# Altium schematic symbol library FPGA_Xilinx_Virtex5.SchLib: 41 symbols (part 26 of 27)
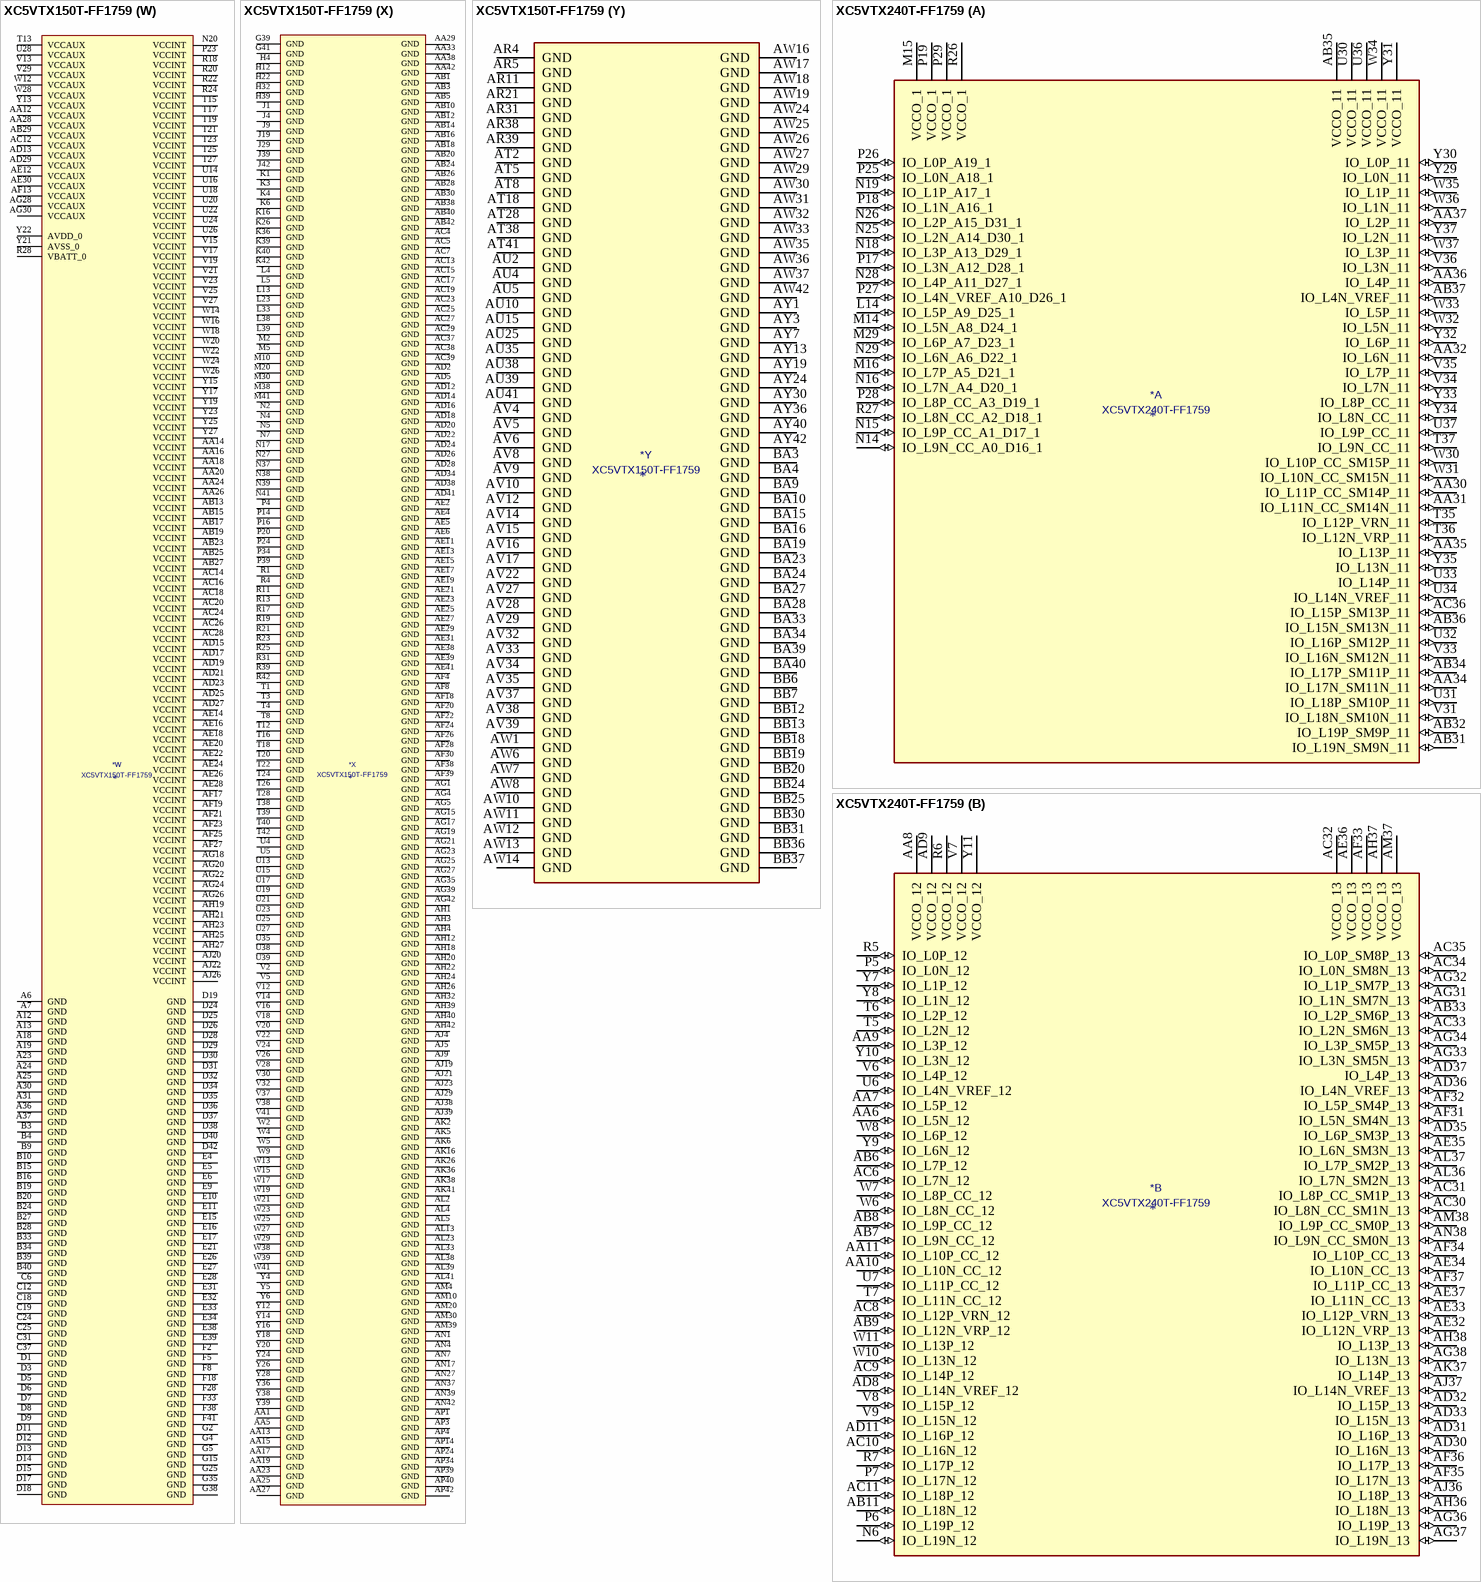
[diagram p162: symbols XC5VTX150T-FF1759 to XC5VTX240T-FF1759]

## XC5VTX150T-FF1759
designator *  value XC5VTX150T-FF1759
ki_keywords: FPGA; ki_description: Virtex 5 TXT 150 XC5VTX150T-FF1759
part A pins: AA30 IO_L11P_CC_SM14P_11 (io), AA31 IO_L11N_CC_SM14N_11 (io), AA32 IO_L6N_11 (io), AA34 IO_L17N_SM11N_11 (io), AA35 IO_L13P_11 (io), AA36 IO_L4P_11 (io), AA37 IO_L2P_11 (io), AB31 IO_L19N_SM9N_11 (io), AB32 IO_L19P_SM9P_11 (io), AB34 IO_L17P_SM11P_11 (io), AB35 VCCO_11 (power), AB36 IO_L15N_SM13N_11 (io), AB37 IO_L4N_VREF_11 (io), AC36 IO_L15P_SM13P_11 (io), L14 IO_L5P_A9_D25_1 (io), M14 IO_L5N_A8_D24_1 (io), M15 VCCO_1 (power), M16 IO_L7P_A5_D21_1 (io), M29 IO_L6P_A7_D23_1 (io), N14 IO_L9N_CC_A0_D16_1 (io), N15 IO_L9P_CC_A1_D17_1 (io), N16 IO_L7N_A4_D20_1 (io), N18 IO_L3P_A13_D29_1 (io), N19 IO_L1P_A17_1 (io), N25 IO_L2N_A14_D30_1 (io), N26 IO_L2P_A15_D31_1 (io), N28 IO_L4P_A11_D27_1 (io), N29 IO_L6N_A6_D22_1 (io), P17 IO_L3N_A12_D28_1 (io), P18 IO_L1N_A16_1 (io), P19 VCCO_1 (power), P25 IO_L0N_A18_1 (io), P26 IO_L0P_A19_1 (io), P27 IO_L4N_VREF_A10_D26_1 (io), P28 IO_L8P_CC_A3_D19_1 (io), P29 VCCO_1 (power), R26 VCCO_1 (power), R27 IO_L8N_CC_A2_D18_1 (io), T35 IO_L12P_VRN_11 (io), T36 IO_L12N_VRP_11 (io), T37 IO_L9N_CC_11 (io), U30 VCCO_11 (power), U31 IO_L18P_SM10P_11 (io), U32 IO_L16P_SM12P_11 (io), U33 IO_L14P_11 (io), U34 IO_L14N_VREF_11 (io), U36 VCCO_11 (power), U37 IO_L9P_CC_11 (io), V31 IO_L18N_SM10N_11 (io), V33 IO_L16N_SM12N_11 (io), V34 IO_L7N_11 (io), V35 IO_L7P_11 (io), V36 IO_L3N_11 (io), W30 IO_L10P_CC_SM15P_11 (io), W31 IO_L10N_CC_SM15N_11 (io), W32 IO_L5N_11 (io), W33 IO_L5P_11 (io), W34 VCCO_11 (power), W35 IO_L1P_11 (io), W36 IO_L1N_11 (io), W37 IO_L3P_11 (io), Y29 IO_L0N_11 (io), Y30 IO_L0P_11 (io), Y31 VCCO_11 (power), Y32 IO_L6P_11 (io), Y33 IO_L8P_CC_11 (io), Y34 IO_L8N_CC_11 (io), Y35 IO_L13N_11 (io), Y37 IO_L2N_11 (io)
part B pins: AA6 IO_L5N_12 (io), AA7 IO_L5P_12 (io), AA8 VCCO_12 (power), AA9 IO_L3P_12 (io), AA10 IO_L10N_CC_12 (io), AA11 IO_L10P_CC_12 (io), AB6 IO_L7P_12 (io), AB7 IO_L9N_CC_12 (io), AB8 IO_L9P_CC_12 (io), AB9 IO_L12N_VRP_12 (io), AB11 IO_L18N_12 (io), AB33 IO_L2P_SM6P_13 (io), AC6 IO_L7N_12 (io), AC8 IO_L12P_VRN_12 (io), AC9 IO_L14P_12 (io), AC10 IO_L16N_12 (io), AC11 IO_L18P_12 (io), AC30 IO_L8N_CC_SM1N_13 (io), AC31 IO_L8P_CC_SM1P_13 (io), AC32 VCCO_13 (power), AC33 IO_L2N_SM6N_13 (io), AC34 IO_L0N_SM8N_13 (io), AC35 IO_L0P_SM8P_13 (io), AD8 IO_L14N_VREF_12 (io), AD9 VCCO_12 (power), AD11 IO_L16P_12 (io), AD30 IO_L16N_13 (io), AD31 IO_L16P_13 (io), AD32 IO_L15P_13 (io), AD33 IO_L15N_13 (io), AD35 IO_L6P_SM3P_13 (io), AD36 IO_L4N_VREF_13 (io), AD37 IO_L4P_13 (io), AE32 IO_L12N_VRP_13 (io), AE33 IO_L12P_VRN_13 (io), AE34 IO_L10N_CC_13 (io), AE35 IO_L6N_SM3N_13 (io), AE36 VCCO_13 (power), AE37 IO_L11N_CC_13 (io), AF31 IO_L5N_SM4N_13 (io), AF32 IO_L5P_SM4P_13 (io), AF33 VCCO_13 (power), AF34 IO_L10P_CC_13 (io), AF35 IO_L17N_13 (io), AF36 IO_L17P_13 (io), AF37 IO_L11P_CC_13 (io), AG31 IO_L1N_SM7N_13 (io), AG32 IO_L1P_SM7P_13 (io), AG33 IO_L3N_SM5N_13 (io), AG34 IO_L3P_SM5P_13 (io), AG36 IO_L19P_13 (io), AG37 IO_L19N_13 (io), AG38 IO_L13N_13 (io), AH36 IO_L18N_13 (io), AH37 VCCO_13 (power), AH38 IO_L13P_13 (io), AJ36 IO_L18P_13 (io), AJ37 IO_L14N_VREF_13 (io), AK37 IO_L14P_13 (io), AL36 IO_L7N_SM2N_13 (io), AL37 IO_L7P_SM2P_13 (io), AM37 VCCO_13 (power), AM38 IO_L9P_CC_SM0P_13 (io), AN38 IO_L9N_CC_SM0N_13 (io), N6 IO_L19N_12 (io), P5 IO_L0N_12 (io), P6 IO_L19P_12 (io), P7 IO_L17N_12 (io), R5 IO_L0P_12 (io), R6 VCCO_12 (power), R7 IO_L17P_12 (io), T5 IO_L2N_12 (io), T6 IO_L2P_12 (io), T7 IO_L11N_CC_12 (io), U6 IO_L4N_VREF_12 (io), U7 IO_L11P_CC_12 (io), V6 IO_L4P_12 (io), V7 VCCO_12 (power), V8 IO_L15P_12 (io), V9 IO_L15N_12 (io), W6 IO_L8N_CC_12 (io), W7 IO_L8P_CC_12 (io), W8 IO_L6P_12 (io), W10 IO_L13N_12 (io), W11 IO_L13P_12 (io), Y7 IO_L1P_12 (io), Y8 IO_L1N_12 (io), Y9 IO_L6N_12 (io), Y10 IO_L3N_12 (io), Y11 VCCO_12 (power)
part C pins: AD6 IO_L1N_14 (io), AD7 IO_L1P_14 (io), AD10 IO_L17P_14 (io), AE7 VCCO_14 (power), AE8 IO_L3P_14 (io), AE9 IO_L16N_14 (io), AE10 IO_L17N_14 (io), AF5 IO_L5P_14 (io), AF6 IO_L5N_14 (io), AF7 IO_L3N_14 (io), AF9 IO_L16P_14 (io), AF10 IO_L8P_CC_14 (io), AF11 IO_L2P_14 (io), AF12 IO_L0N_14 (io), AG6 IO_L7P_14 (io), AG7 IO_L9P_CC_14 (io), AG8 IO_L10P_CC_14 (io), AG9 IO_L8N_CC_14 (io), AG10 VCCO_14 (power), AG11 IO_L2N_14 (io), AG12 IO_L0P_14 (io), AH5 IO_L7N_14 (io), AH6 IO_L9N_CC_14 (io), AH7 VCCO_14 (power), AH8 IO_L10N_CC_14 (io), AH9 IO_L13P_14 (io), AH10 IO_L4N_VREF_14 (io), AH11 IO_L4P_14 (io), AH17 VCCO_2 (power), AJ6 IO_L12P_VRN_14 (io), AJ7 IO_L12N_VRP_14 (io), AJ8 IO_L13N_14 (io), AJ17 IO_L0P_CC_RS1_2 (io), AJ18 IO_L2N_A22_2 (io), AK7 IO_L14P_14 (io), AK8 IO_L11P_CC_14 (io), AK9 IO_L6P_14 (io), AK17 IO_L0N_CC_RS0_2 (io), AK18 IO_L2P_A23_2 (io), AK19 IO_L8N_D2_FS2_2 (io), AK27 IO_L1N_CC_A24_2 (io), AK28 IO_L1P_CC_A25_2 (io), AL6 IO_L14N_VREF_14 (io), AL7 IO_L11N_CC_14 (io), AL8 VCCO_14 (power), AL9 IO_L6N_14 (io), AL17 IO_L4P_FCS_B_2 (io), AL18 VCCO_2 (power), AL19 IO_L8P_D3_2 (io), AL27 IO_L3P_A21_2 (io), AL28 VCCO_2 (power), AM5 IO_L18P_14 (io), AM6 IO_L19P_14 (io), AM7 IO_L19N_14 (io), AM17 IO_L4N_VREF_FOE_B_MOSI_2 (io), AM18 IO_L6P_D7_2 (io), AM19 IO_L6N_D6_2 (io), AM27 IO_L3N_A20_2 (io), AN5 IO_L18N_14 (io), AN6 VCCO_14 (power), AN26 IO_L7N_D4_2 (io), AP5 IO_L15P_14 (io), AP6 IO_L15N_14 (io), AP25 IO_L9P_D1_FS1_2 (io), AP26 IO_L7P_D5_2 (io), AP27 IO_L5N_CSO_B_2 (io), AR25 IO_L9N_D0_FS0_2 (io), AR26 VCCO_2 (power), AR27 IO_L5P_FWE_B_2 (io)
part D pins: E7 IO_L3P_24 (io), E8 IO_L3N_24 (io), F6 IO_L5N_24 (io), F7 VCCO_24 (power), G6 IO_L5P_24 (io), G7 IO_L1P_24 (io), G8 IO_L1N_24 (io), G37 IO_L4P_23 (io), H5 IO_L7N_24 (io), H6 IO_L7P_24 (io), H7 VCCO_24 (power), H8 IO_L9N_CC_24 (io), H34 IO_L0N_23 (io), H35 IO_L2P_23 (io), H36 IO_L2N_23 (io), H37 VCCO_23 (power), H38 IO_L4N_VREF_23 (io), J5 IO_L14N_VREF_24 (io), J6 IO_L14P_24 (io), J7 IO_L18P_24 (io), J8 IO_L9P_CC_24 (io), J33 IO_L0P_23 (io), J34 VCCO_23 (power), J35 IO_L15N_23 (io), J36 IO_L15P_23 (io), J37 IO_L8P_CC_23 (io), J38 IO_L8N_CC_23 (io), K5 IO_L4N_VREF_24 (io), K7 IO_L19P_24 (io), K8 IO_L18N_24 (io), K9 IO_L12P_VRN_24 (io), K33 IO_L6N_23 (io), K34 IO_L6P_23 (io), K35 IO_L19N_23 (io), K37 IO_L17P_23 (io), K38 IO_L17N_23 (io), L6 IO_L4P_24 (io), L7 IO_L19N_24 (io), L8 VCCO_24 (power), L9 IO_L12N_VRP_24 (io), L34 IO_L19P_23 (io), L35 IO_L12P_VRN_23 (io), L36 IO_L12N_VRP_23 (io), L37 IO_L16N_23 (io), M6 IO_L17N_24 (io), M7 IO_L17P_24 (io), M8 IO_L15P_24 (io), M9 IO_L16N_24 (io), M34 IO_L14N_VREF_23 (io), M35 VCCO_23 (power), M36 IO_L10N_CC_23 (io), M37 IO_L16P_23 (io), N8 IO_L15N_24 (io), N9 IO_L16P_24 (io), N33 IO_L11N_CC_23 (io), N34 IO_L14P_23 (io), N35 IO_L7N_23 (io), N36 IO_L10P_CC_23 (io), P8 IO_L11N_CC_24 (io), P9 VCCO_24 (power), P10 IO_L10P_CC_24 (io), P33 IO_L11P_CC_23 (io), P35 IO_L7P_23 (io), P36 IO_L5N_23 (io), P37 IO_L1N_23 (io), P38 IO_L3N_23 (io), R8 IO_L8P_CC_24 (io), R9 IO_L11P_CC_24 (io), R10 IO_L10N_CC_24 (io), R32 IO_L13N_23 (io), R33 IO_L13P_23 (io), R34 IO_L9P_CC_23 (io), R35 IO_L5P_23 (io), R36 VCCO_23 (power), R37 IO_L1P_23 (io), R38 IO_L3P_23 (io), T9 IO_L8N_CC_24 (io), T10 IO_L13N_24 (io), T11 IO_L13P_24 (io), T31 IO_L18P_23 (io), T32 IO_L18N_23 (io), T33 VCCO_23 (power), T34 IO_L9N_CC_23 (io), U8 IO_L6N_24 (io), U9 IO_L6P_24 (io), U10 VCCO_24 (power), U11 IO_L2N_24 (io), U12 IO_L0N_24 (io), V10 IO_L2P_24 (io), V11 IO_L0P_24 (io)
part E pins: AH33 IO_L10N_CC_25 (io), AH34 IO_L10P_CC_25 (io), AH35 IO_L12P_VRN_25 (io), AJ10 IO_L4P_26 (io), AJ11 IO_L4N_VREF_26 (io), AJ12 IO_L9P_CC_26 (io), AJ31 IO_L3P_25 (io), AJ32 IO_L3N_25 (io), AJ33 IO_L0P_25 (io), AJ34 VCCO_25 (power), AJ35 IO_L12N_VRP_25 (io), AK10 IO_L2N_26 (io), AK11 VCCO_26 (power), AK12 IO_L9N_CC_26 (io), AK32 IO_L13P_25 (io), AK33 IO_L13N_25 (io), AK34 IO_L0N_25 (io), AK35 IO_L9N_CC_25 (io), AL10 IO_L2P_26 (io), AL11 IO_L7N_26 (io), AL12 IO_L10N_CC_26 (io), AL31 IO_L19P_25 (io), AL32 IO_L19N_25 (io), AL34 IO_L9P_CC_25 (io), AL35 IO_L18P_25 (io), AM8 IO_L17N_26 (io), AM9 IO_L17P_26 (io), AM11 IO_L7P_26 (io), AM12 IO_L10P_CC_26 (io), AM13 IO_L18P_26 (io), AM31 IO_L17P_25 (io), AM32 IO_L17N_25 (io), AM33 IO_L8N_CC_25 (io), AM34 IO_L6P_25 (io), AM35 VCCO_25 (power), AM36 IO_L18N_25 (io), AN8 IO_L15N_26 (io), AN9 IO_L6P_26 (io), AN10 IO_L6N_26 (io), AN11 IO_L3N_26 (io), AN12 VCCO_26 (power), AN13 IO_L18N_26 (io), AN31 IO_L15P_25 (io), AN32 VCCO_25 (power), AN33 IO_L8P_CC_25 (io), AN34 IO_L6N_25 (io), AN35 IO_L16N_25 (io), AN36 IO_L16P_25 (io), AP7 IO_L19N_26 (io), AP8 IO_L15P_26 (io), AP9 VCCO_26 (power), AP10 IO_L3P_26 (io), AP11 IO_L5P_26 (io), AP12 IO_L5N_26 (io), AP13 IO_L16P_26 (io), AP31 IO_L15N_25 (io), AP32 IO_L11P_CC_25 (io), AP33 IO_L11N_CC_25 (io), AP35 IO_L7N_25 (io), AP36 IO_L7P_25 (io), AP37 IO_L14P_25 (io), AP38 IO_L14N_VREF_25 (io), AR6 IO_L19P_26 (io), AR7 IO_L8P_CC_26 (io), AR8 IO_L0P_26 (io), AR9 IO_L0N_26 (io), AR10 IO_L1P_26 (io), AR12 IO_L16N_26 (io), AR35 IO_L4P_25 (io), AR36 VCCO_25 (power), AR37 IO_L5N_25 (io), AT6 IO_L13N_26 (io), AT7 IO_L8N_CC_26 (io), AT9 IO_L1N_26 (io), AT10 IO_L12N_VRP_26 (io), AT11 VCCO_26 (power), AT35 IO_L4N_VREF_25 (io), AT36 IO_L1P_25 (io), AT37 IO_L5P_25 (io), AU6 IO_L13P_26 (io), AU7 VCCO_26 (power), AU8 IO_L11P_CC_26 (io), AU9 IO_L12P_VRN_26 (io), AU11 IO_L14P_26 (io), AU36 IO_L2N_25 (io), AU37 IO_L1N_25 (io), AV7 IO_L11N_CC_26 (io), AV11 IO_L14N_VREF_26 (io), AV36 IO_L2P_25 (io)
part F pins: E12 IO_L4P_28 (io), E13 IO_L4N_VREF_28 (io), E14 IO_L15P_28 (io), E29 IO_L16P_27 (io), E30 IO_L14N_VREF_27 (io), E35 IO_L4N_VREF_27 (io), E36 IO_L4P_27 (io), E37 IO_L6P_27 (io), F9 IO_L0N_28 (io), F10 IO_L0P_28 (io), F11 IO_L2N_28 (io), F12 IO_L11N_CC_28 (io), F13 VCCO_28 (power), F14 IO_L15N_28 (io), F15 IO_L17P_28 (io), F29 IO_L16N_27 (io), F30 IO_L14P_27 (io), F31 IO_L12N_VRP_27 (io), F32 IO_L5N_27 (io), F34 IO_L3P_27 (io), F35 IO_L2P_27 (io), F36 VCCO_27 (power), F37 IO_L6N_27 (io), G9 IO_L3P_28 (io), G10 VCCO_28 (power), G11 IO_L2P_28 (io), G12 IO_L11P_CC_28 (io), G13 IO_L13N_28 (io), G14 IO_L17N_28 (io), G29 IO_L18P_27 (io), G30 VCCO_27 (power), G31 IO_L12P_VRN_27 (io), G32 IO_L5P_27 (io), G33 VCCO_27 (power), G34 IO_L3N_27 (io), G36 IO_L2N_27 (io), H9 IO_L3N_28 (io), H10 IO_L1N_28 (io), H11 IO_L8P_CC_28 (io), H13 IO_L13P_28 (io), H14 IO_L19P_28 (io), H15 IO_L19N_28 (io), H29 IO_L18N_27 (io), H30 IO_L10N_CC_27 (io), H31 IO_L7P_27 (io), H33 IO_L1N_27 (io), J10 IO_L5P_28 (io), J11 IO_L1P_28 (io), J12 IO_L8N_CC_28 (io), J13 IO_L6N_28 (io), J30 IO_L10P_CC_27 (io), J31 IO_L7N_27 (io), J32 IO_L1P_27 (io), K10 IO_L5N_28 (io), K11 VCCO_28 (power), K12 IO_L7N_28 (io), K13 IO_L7P_28 (io), K14 IO_L6P_28 (io), K29 IO_L9P_CC_27 (io), K30 IO_L0N_27 (io), K31 VCCO_27 (power), K32 IO_L8N_CC_27 (io), L10 IO_L10P_CC_28 (io), L11 IO_L10N_CC_28 (io), L12 IO_L9P_CC_28 (io), L29 IO_L9N_CC_27 (io), L30 IO_L0P_27 (io), L31 IO_L8P_CC_27 (io), L32 IO_L11N_CC_27 (io), M11 IO_L14P_28 (io), M12 IO_L9N_CC_28 (io), M13 IO_L12N_VRP_28 (io), M31 IO_L13P_27 (io), M32 IO_L13N_27 (io), M33 IO_L11P_CC_27 (io), N10 IO_L14N_VREF_28 (io), N11 IO_L16N_28 (io), N12 VCCO_28 (power), N13 IO_L12P_VRN_28 (io), N30 IO_L15N_27 (io), N31 IO_L15P_27 (io), N32 VCCO_27 (power), P11 IO_L16P_28 (io), P12 IO_L18P_28 (io), P30 IO_L19P_27 (io), P31 IO_L17P_27 (io), P32 IO_L17N_27 (io), R12 IO_L18N_28 (io), R30 IO_L19N_27 (io)
part G pins: AH29 IO_L0N_29 (io), AH30 IO_L0P_29 (io), AH31 IO_L2P_29 (io), AJ30 IO_L2N_29 (io), AK29 IO_L4P_29 (io), AK30 IO_L4N_VREF_29 (io), AK31 VCCO_29 (power), AL29 IO_L17P_29 (io), AL30 IO_L17N_29 (io), AM28 IO_L9P_CC_29 (io), AM29 IO_L15P_29 (io), AN28 IO_L1P_29 (io), AN29 IO_L9N_CC_29 (io), AN30 IO_L15N_29 (io), AP28 IO_L1N_29 (io), AP29 VCCO_29 (power), AP30 IO_L12N_VRP_29 (io), AR28 IO_L10P_CC_29 (io), AR29 IO_L10N_CC_29 (io), AR30 IO_L12P_VRN_29 (io), AR32 IO_L13P_29 (io), AR33 IO_L8N_CC_29 (io), AR34 IO_L8P_CC_29 (io), AT25 IO_L3N_29 (io), AT26 IO_L3P_29 (io), AT27 IO_L7N_29 (io), AT29 IO_L14P_29 (io), AT30 IO_L19P_29 (io), AT31 IO_L19N_29 (io), AT32 IO_L13N_29 (io), AT33 VCCO_29 (power), AT34 IO_L6N_29 (io), AU26 VCCO_29 (power), AU27 IO_L7P_29 (io), AU28 IO_L14N_VREF_29 (io), AU29 IO_L16P_29 (io), AU30 VCCO_29 (power), AU31 IO_L18N_29 (io), AU32 IO_L11P_CC_29 (io), AU33 IO_L11N_CC_29 (io), AU34 IO_L6P_29 (io), AV25 IO_L5N_29 (io), AV26 IO_L5P_29 (io), AV30 IO_L16N_29 (io), AV31 IO_L18P_29 (io), J14 VCCO_3 (power), J15 IO_L2P_GC_VRN_3 (io), J16 IO_L2N_GC_VRP_3 (io), K15 IO_L4N_GC_VREF_3 (io), K27 IO_L7P_GC_3 (io), K28 IO_L7N_GC_3 (io), L15 IO_L4P_GC_3 (io), L16 IO_L8P_GC_3 (io), L17 IO_L8N_GC_3 (io), L18 VCCO_3 (power), L19 IO_L0P_CC_GC_3 (io), L25 IO_L3N_GC_3 (io), L26 IO_L5P_GC_3 (io), L27 IO_L5N_GC_3 (io), L28 VCCO_3 (power), M17 IO_L6P_GC_3 (io), M18 IO_L6N_GC_3 (io), M19 IO_L0N_CC_GC_3 (io), M24 IO_L1N_CC_GC_3 (io), M25 VCCO_3 (power), M26 IO_L3P_GC_3 (io), M27 IO_L9N_GC_3 (io), M28 IO_L9P_GC_3 (io), N24 IO_L1P_CC_GC_3 (io)
part H pins: AG13 IO_L3N_30 (io), AH13 IO_L5P_30 (io), AH14 IO_L3P_30 (io), AH15 IO_L1N_30 (io), AJ13 IO_L5N_30 (io), AJ14 VCCO_30 (power), AJ15 IO_L1P_30 (io), AJ24 VCCO_4 (power), AJ25 IO_L4P_GC_4 (io), AK13 IO_L7P_30 (io), AK14 IO_L7N_30 (io), AK15 IO_L19P_30 (io), AK20 IO_L9P_CC_GC_4 (io), AK21 VCCO_4 (power), AK23 IO_L8P_CC_GC_4 (io), AK24 IO_L8N_CC_GC_4 (io), AK25 IO_L4N_GC_VREF_4 (io), AL14 IO_L16N_30 (io), AL15 IO_L19N_30 (io), AL16 IO_L4P_30 (io), AL20 IO_L9N_CC_GC_4 (io), AL21 IO_L7P_GC_VRN_4 (io), AL24 IO_L6N_GC_4 (io), AL25 IO_L6P_GC_4 (io), AL26 IO_L0P_GC_D15_4 (io), AM14 IO_L16P_30 (io), AM15 VCCO_30 (power), AM16 IO_L4N_VREF_30 (io), AM21 IO_L7N_GC_VRP_4 (io), AM24 IO_L2N_GC_D10_4 (io), AM25 VCCO_4 (power), AM26 IO_L0N_GC_D14_4 (io), AN14 IO_L10P_CC_30 (io), AN15 IO_L10N_CC_30 (io), AN16 IO_L11P_CC_30 (io), AN18 IO_L2P_30 (io), AN19 IO_L1N_GC_D12_4 (io), AN20 IO_L1P_GC_D13_4 (io), AN25 IO_L2P_GC_D11_4 (io), AP15 IO_L14P_30 (io), AP16 IO_L15N_30 (io), AP17 IO_L11N_CC_30 (io), AP18 IO_L2N_30 (io), AP19 VCCO_4 (power), AP20 IO_L5N_GC_4 (io), AP21 IO_L5P_GC_4 (io), AR13 IO_L9N_CC_30 (io), AR14 IO_L14N_VREF_30 (io), AR15 IO_L15P_30 (io), AR16 VCCO_30 (power), AR17 IO_L8N_CC_30 (io), AR18 IO_L0N_30 (io), AR19 IO_L0P_30 (io), AR20 IO_L3P_GC_D9_4 (io), AT12 IO_L9P_CC_30 (io), AT13 VCCO_30 (power), AT14 IO_L12N_VRP_30 (io), AT15 IO_L17N_30 (io), AT16 IO_L13P_30 (io), AT17 IO_L8P_CC_30 (io), AT20 IO_L3N_GC_D8_4 (io), AU12 IO_L18P_30 (io), AU13 IO_L12P_VRN_30 (io), AU14 IO_L17P_30 (io), AU16 IO_L13N_30 (io), AU17 IO_L6N_30 (io), AU18 IO_L6P_30 (io), AV13 IO_L18N_30 (io)
part I pins: AK22 IO_L12N_VRP_6 (io), AL22 IO_L12P_VRN_6 (io), AM22 IO_L10N_CC_6 (io), AM23 IO_L8P_CC_6 (io), AN21 IO_L10P_CC_6 (io), AN22 VCCO_6 (power), AN23 IO_L13P_6 (io), AN24 IO_L8N_CC_6 (io), AP22 IO_L17N_6 (io), AP23 IO_L13N_6 (io), AR22 IO_L17P_6 (io), AR23 IO_L15P_6 (io), AR24 IO_L0P_6 (io), AT19 IO_L7P_6 (io), AT21 IO_L19N_6 (io), AT22 IO_L15N_6 (io), AT23 VCCO_6 (power), AT24 IO_L0N_6 (io), AU19 IO_L7N_6 (io), AU20 VCCO_6 (power), AU21 IO_L19P_6 (io), AU22 IO_L18N_6 (io), AU23 IO_L6N_6 (io), AU24 IO_L2N_6 (io), AV18 IO_L1P_6 (io), AV19 IO_L1N_6 (io), AV20 IO_L9P_CC_6 (io), AV21 IO_L18P_6 (io), AV23 IO_L6P_6 (io), AV24 IO_L2P_6 (io), AW20 IO_L9N_CC_6 (io), AW21 IO_L16P_6 (io), AW22 IO_L16N_6 (io), AW23 IO_L11P_CC_6 (io), AY20 IO_L14N_VREF_6 (io), AY21 VCCO_6 (power), AY22 IO_L5N_6 (io), AY23 IO_L11N_CC_6 (io), BA20 IO_L14P_6 (io), BA21 IO_L5P_6 (io), BA22 IO_L3P_6 (io), BB21 IO_L3N_6 (io), BB22 IO_L4P_6 (io), BB23 IO_L4N_VREF_6 (io), E18 IO_L14N_VREF_5 (io), E19 IO_L14P_5 (io), E20 IO_L1P_5 (io), F16 IO_L16N_5 (io), F17 IO_L16P_5 (io), F19 IO_L5P_5 (io), F20 IO_L1N_5 (io), F26 IO_L8P_CC_5 (io), F27 IO_L13N_5 (io), G16 IO_L18N_5 (io), G17 IO_L7N_5 (io), G18 IO_L7P_5 (io), G19 IO_L5N_5 (io), G20 VCCO_5 (power), G24 IO_L6P_5 (io), G26 IO_L8N_CC_5 (io), G27 IO_L13P_5 (io), G28 IO_L17N_5 (io), H16 IO_L18P_5 (io), H17 VCCO_5 (power), H18 IO_L12N_VRP_5 (io), H19 IO_L3N_5 (io), H20 IO_L3P_5 (io), H23 IO_L4P_5 (io), H24 IO_L4N_VREF_5 (io), H25 IO_L6N_5 (io), H26 IO_L15N_5 (io), H27 VCCO_5 (power), H28 IO_L17P_5 (io), J17 IO_L9P_CC_5 (io), J18 IO_L12P_VRN_5 (io), J23 IO_L0N_5 (io), J24 VCCO_5 (power), J25 IO_L11N_CC_5 (io), J26 IO_L15P_5 (io), J27 IO_L19N_5 (io), J28 IO_L19P_5 (io), K17 IO_L9N_CC_5 (io), K18 IO_L10P_CC_5 (io), K19 IO_L10N_CC_5 (io), K23 IO_L0P_5 (io), K24 IO_L2P_5 (io), K25 IO_L11P_CC_5 (io), L24 IO_L2N_5 (io)
part J pins: A20 IO_L14P_7 (io), A21 IO_L14N_VREF_7 (io), A22 IO_L11N_CC_7 (io), B21 IO_L11P_CC_7 (io), B22 IO_L8P_CC_7 (io), B23 IO_L8N_CC_7 (io), C20 IO_L12N_VRP_7 (io), C21 IO_L6P_7 (io), C22 VCCO_7 (power), C23 IO_L4N_VREF_7 (io), D20 IO_L12P_VRN_7 (io), D21 IO_L6N_7 (io), D22 IO_L4P_7 (io), D23 IO_L3P_7 (io), E22 IO_L3N_7 (io), E23 IO_L17N_7 (io), E24 IO_L17P_7 (io), E25 IO_L19N_7 (io), F21 IO_L9P_CC_7 (io), F22 IO_L5P_7 (io), F23 VCCO_7 (power), F24 IO_L13N_7 (io), F25 IO_L19P_7 (io), G21 IO_L9N_CC_7 (io), G22 IO_L5N_7 (io), G23 IO_L13P_7 (io), H21 IO_L10N_CC_7 (io), J20 IO_L10P_CC_7 (io), J21 IO_L0N_7 (io), J22 IO_L0P_7 (io), K20 IO_L16N_7 (io), K21 VCCO_7 (power), K22 IO_L7P_7 (io), L20 IO_L16P_7 (io), L21 IO_L7N_7 (io), L22 IO_L2N_7 (io), M21 IO_L1N_7 (io), M22 IO_L2P_7 (io), M23 IO_L15P_7 (io), N21 IO_L1P_7 (io), N22 VCCO_7 (power), N23 IO_L15N_7 (io), P21 IO_L18P_7 (io), P22 IO_L18N_7 (io)
part K pins: AA2 MGTTXP1_112 (io), AA41 MGTTXP1_111 (io), T2 MGTTXP0_112 (io), T41 MGTTXP0_111 (io), U1 MGTRXP0_112 (io), U2 MGTTXN0_112 (io), U41 MGTTXN0_111 (io), U42 MGTRXP0_111 (io), V1 MGTRXN0_112 (io), V3 MGTREFCLKN_112 (io), V4 MGTREFCLKP_112 (io), V39 MGTREFCLKP_111 (io), V40 MGTREFCLKN_111 (io), V42 MGTRXN0_111 (io), W1 MGTRXN1_112 (io), W42 MGTRXN1_111 (io), Y1 MGTRXP1_112 (io), Y2 MGTTXN1_112 (io), Y41 MGTTXN1_111 (io), Y42 MGTRXP1_111 (io)
part L pins: AB2 MGTTXP0_114 (io), AB41 MGTTXP0_113 (io), AC1 MGTRXP0_114 (io), AC2 MGTTXN0_114 (io), AC41 MGTTXN0_113 (io), AC42 MGTRXP0_113 (io), AD1 MGTRXN0_114 (io), AD3 MGTREFCLKN_114 (io), AD4 MGTREFCLKP_114 (io), AD39 MGTREFCLKP_113 (io), AD40 MGTREFCLKN_113 (io), AD42 MGTRXN0_113 (io), AE1 MGTRXN1_114 (io), AE42 MGTRXN1_113 (io), AF1 MGTRXP1_114 (io), AF2 MGTTXN1_114 (io), AF41 MGTTXN1_113 (io), AF42 MGTRXP1_113 (io), AG2 MGTTXP1_114 (io), AG41 MGTTXP1_113 (io)
part M pins: K2 MGTTXP0_116 (io), K41 MGTTXP0_115 (io), L1 MGTRXP0_116 (io), L2 MGTTXN0_116 (io), L41 MGTTXN0_115 (io), L42 MGTRXP0_115 (io), M1 MGTRXN0_116 (io), M3 MGTREFCLKN_116 (io), M4 MGTREFCLKP_116 (io), M39 MGTREFCLKP_115 (io), M40 MGTREFCLKN_115 (io), M42 MGTRXN0_115 (io), N1 MGTRXN1_116 (io), N42 MGTRXN1_115 (io), P1 MGTRXP1_116 (io), P2 MGTTXN1_116 (io), P41 MGTTXN1_115 (io), P42 MGTRXP1_115 (io), R2 MGTTXP1_116 (io), R41 MGTTXP1_115 (io)
part N pins: AH2 MGTTXP0_118 (io), AH41 MGTTXP0_117 (io), AJ1 MGTRXP0_118 (io), AJ2 MGTTXN0_118 (io), AJ41 MGTTXN0_117 (io), AJ42 MGTRXP0_117 (io), AK1 MGTRXN0_118 (io), AK3 MGTREFCLKN_118 (io), AK4 MGTREFCLKP_118 (io), AK39 MGTREFCLKP_117 (io), AK40 MGTREFCLKN_117 (io), AK42 MGTRXN0_117 (io), AL1 MGTRXN1_118 (io), AL42 MGTRXN1_117 (io), AM1 MGTRXP1_118 (io), AM2 MGTTXN1_118 (io), AM41 MGTTXN1_117 (io), AM42 MGTRXP1_117 (io), AN2 MGTTXP1_118 (io), AN41 MGTTXP1_117 (io)
part O pins: D2 MGTTXP0_120 (io), D41 MGTTXP0_119 (io), E1 MGTRXP0_120 (io), E2 MGTTXN0_120 (io), E41 MGTTXN0_119 (io), E42 MGTRXP0_119 (io), F1 MGTRXN0_120 (io), F3 MGTREFCLKN_120 (io), F4 MGTREFCLKP_120 (io), F39 MGTREFCLKP_119 (io), F40 MGTREFCLKN_119 (io), F42 MGTRXN0_119 (io), G1 MGTRXN1_120 (io), G42 MGTRXN1_119 (io), H1 MGTRXP1_120 (io), H2 MGTTXN1_120 (io), H41 MGTTXN1_119 (io), H42 MGTRXP1_119 (io), J2 MGTTXP1_120 (io), J41 MGTTXP1_119 (io)
part P pins: AP2 MGTTXP0_122 (io), AP41 MGTTXP0_121 (io), AR1 MGTRXP0_122 (io), AR2 MGTTXN0_122 (io), AR41 MGTTXN0_121 (io), AR42 MGTRXP0_121 (io), AT1 MGTRXN0_122 (io), AT3 MGTREFCLKN_122 (io), AT4 MGTREFCLKP_122 (io), AT39 MGTREFCLKP_121 (io), AT40 MGTREFCLKN_121 (io), AT42 MGTRXN0_121 (io), AU1 MGTRXN1_122 (io), AU42 MGTRXN1_121 (io), AV1 MGTRXP1_122 (io), AV2 MGTTXN1_122 (io), AV41 MGTTXN1_121 (io), AV42 MGTRXP1_121 (io), AW2 MGTTXP1_122 (io), AW41 MGTTXP1_121 (io)
part Q pins: A2 MGTRXP1_124 (io), A3 MGTRXN1_124 (io), A4 MGTRXN0_124 (io), A5 MGTRXP0_124 (io), A38 MGTRXP0_123 (io), A39 MGTRXN0_123 (io), A40 MGTRXN1_123 (io), A41 MGTRXP1_123 (io), B1 MGTTXP1_124 (io), B2 MGTTXN1_124 (io), B5 MGTTXN0_124 (io), B6 MGTTXP0_124 (io), B37 MGTTXP0_123 (io), B38 MGTTXN0_123 (io), B41 MGTTXN1_123 (io), B42 MGTTXP1_123 (io), C3 MGTREFCLKN_124 (io), C4 MGTREFCLKP_124 (io), C39 MGTREFCLKP_123 (io), C40 MGTREFCLKN_123 (io)
part R pins: AW4 MGTREFCLKP_126 (io), AW39 MGTREFCLKP_125 (io), AY4 MGTREFCLKN_126 (io), AY39 MGTREFCLKN_125 (io), BA1 MGTTXP0_126 (io), BA2 MGTTXN0_126 (io), BA5 MGTTXN1_126 (io), BA6 MGTTXP1_126 (io), BA37 MGTTXP1_125 (io), BA38 MGTTXN1_125 (io), BA41 MGTTXN0_125 (io), BA42 MGTTXP0_125 (io), BB2 MGTRXP0_126 (io), BB3 MGTRXN0_126 (io), BB4 MGTRXN1_126 (io), BB5 MGTRXP1_126 (io), BB38 MGTRXP1_125 (io), BB39 MGTRXN1_125 (io), BB40 MGTRXN0_125 (io), BB41 MGTRXP0_125 (io)
part S pins: A8 MGTRXP1_128 (io), A9 MGTRXN1_128 (io), A10 MGTRXN0_128 (io), A11 MGTRXP0_128 (io), A32 MGTRXP0_127 (io), A33 MGTRXN0_127 (io), A34 MGTRXN1_127 (io), A35 MGTRXP1_127 (io), B7 MGTTXP1_128 (io), B8 MGTTXN1_128 (io), B11 MGTTXN0_128 (io), B12 MGTTXP0_128 (io), B31 MGTTXP0_127 (io), B32 MGTTXN0_127 (io), B35 MGTTXN1_127 (io), B36 MGTTXP1_127 (io), C10 MGTREFCLKN_128 (io), C33 MGTREFCLKN_127 (io), D10 MGTREFCLKP_128 (io), D33 MGTREFCLKP_127 (io)
part T pins: AW9 MGTREFCLKP_130 (io), AW34 MGTREFCLKP_129 (io), AY9 MGTREFCLKN_130 (io), AY34 MGTREFCLKN_129 (io), BA7 MGTTXP0_130 (io), BA8 MGTTXN0_130 (io), BA11 MGTTXN1_130 (io), BA12 MGTTXP1_130 (io), BA31 MGTTXP1_129 (io), BA32 MGTTXN1_129 (io), BA35 MGTTXN0_129 (io), BA36 MGTTXP0_129 (io), BB8 MGTRXP0_130 (io), BB9 MGTRXN0_130 (io), BB10 MGTRXN1_130 (io), BB11 MGTRXP1_130 (io), BB32 MGTRXP1_129 (io), BB33 MGTRXN1_129 (io), BB34 MGTRXN0_129 (io), BB35 MGTRXP0_129 (io)
part U pins: AA3 MGTAVTTTX_112 (power), AA4 MGTAVTTRXC_R (power), AA39 MGTAVTTRXC_L (power), AA40 MGTAVTTTX_111 (power), AB4 MGTRREF_112 (power), AB39 MGTRREF_111 (power), AC3 MGTAVTTRX_114 (power), AC40 MGTAVTTRX_113 (power), AE3 MGTAVCC_114 (power), AE40 MGTAVCC_113 (power), AF3 MGTAVCCPLL_114 (power), AF40 MGTAVCCPLL_113 (power), AG3 MGTAVTTTX_114 (power), AG40 MGTAVTTTX_113 (power), AJ3 MGTAVTTRX_118 (power), AJ40 MGTAVTTRX_117 (power), AL3 MGTAVCC_118 (power), AL40 MGTAVCC_117 (power), AM3 MGTAVCCPLL_118 (power), AM40 MGTAVCCPLL_117 (power), AN3 MGTAVTTTX_118 (power), AN40 MGTAVTTTX_117 (power), AR3 MGTAVTTRX_122 (power), AR40 MGTAVTTRX_121 (power), AU3 MGTAVCC_122 (power), AU40 MGTAVCC_121 (power), AV3 MGTAVCCPLL_122 (power), AV40 MGTAVCCPLL_121 (power), AW3 MGTAVTTTX_122 (power), AW5 MGTAVCC_126 (power), AW38 MGTAVCC_125 (power), AW40 MGTAVTTTX_121 (power), AY2 MGTAVTTRX_126 (power), AY5 MGTAVCCPLL_126 (power), AY6 MGTAVTTTX_126 (power), AY8 MGTAVTTRX_130 (power), AY10 MGTAVCC_130 (power), AY11 MGTAVCCPLL_130 (power), AY12 MGTAVTTTX_130 (power), AY31 MGTAVTTTX_129 (power), AY32 MGTAVCCPLL_129 (power), AY33 MGTAVCC_129 (power), AY35 MGTAVTTRX_129 (power), AY37 MGTAVTTTX_125 (power), AY38 MGTAVCCPLL_125 (power), AY41 MGTAVTTRX_125 (power), C1 MGTAVTTTX_124 (power), C2 MGTAVCCPLL_124 (power), C5 MGTAVTTRX_124 (power), C7 MGTAVTTTX_128 (power), C8 MGTAVCCPLL_128 (power), C9 MGTAVCC_128 (power), C11 MGTAVTTRX_128 (power), C32 MGTAVTTRX_127 (power), C34 MGTAVCC_127 (power), C35 MGTAVCCPLL_127 (power), C36 MGTAVTTTX_127 (power), C38 MGTAVTTRX_123 (power), C41 MGTAVCCPLL_123 (power), C42 MGTAVTTTX_123 (power), D4 MGTAVCC_124 (power), D39 MGTAVCC_123 (power), E3 MGTAVTTRX_120 (power), E40 MGTAVTTRX_119 (power), G3 MGTAVCC_120 (power), G40 MGTAVCC_119 (power), H3 MGTAVCCPLL_120 (power), H40 MGTAVCCPLL_119 (power), J3 MGTAVTTTX_120 (power), J40 MGTAVTTTX_119 (power), L3 MGTAVTTRX_116 (power), L40 MGTAVTTRX_115 (power), N3 MGTAVCC_116 (power), N40 MGTAVCC_115 (power), P3 MGTAVCCPLL_116 (power), P40 MGTAVCCPLL_115 (power), R3 MGTAVTTTX_116 (power), R40 MGTAVTTTX_115 (power), U3 MGTAVTTRX_112 (power), U40 MGTAVTTRX_111 (power), W3 MGTAVCC_112 (power), W40 MGTAVCC_111 (power), Y3 MGTAVCCPLL_112 (power), Y40 MGTAVCCPLL_111 (power)